# Altium footprint library THU.PcbLib: 477 footprints (part 21 of 30)
Each footprint in its own frame and in the unit in brackets; x right, y up, seen from the top. Pads: shape width x height; smd on the part's side, far side on the other; paste and mask are expansions set on the pad; w line width, h text height; cw(c..) or ccw(c..) is an arc to the next point about the centre after c.
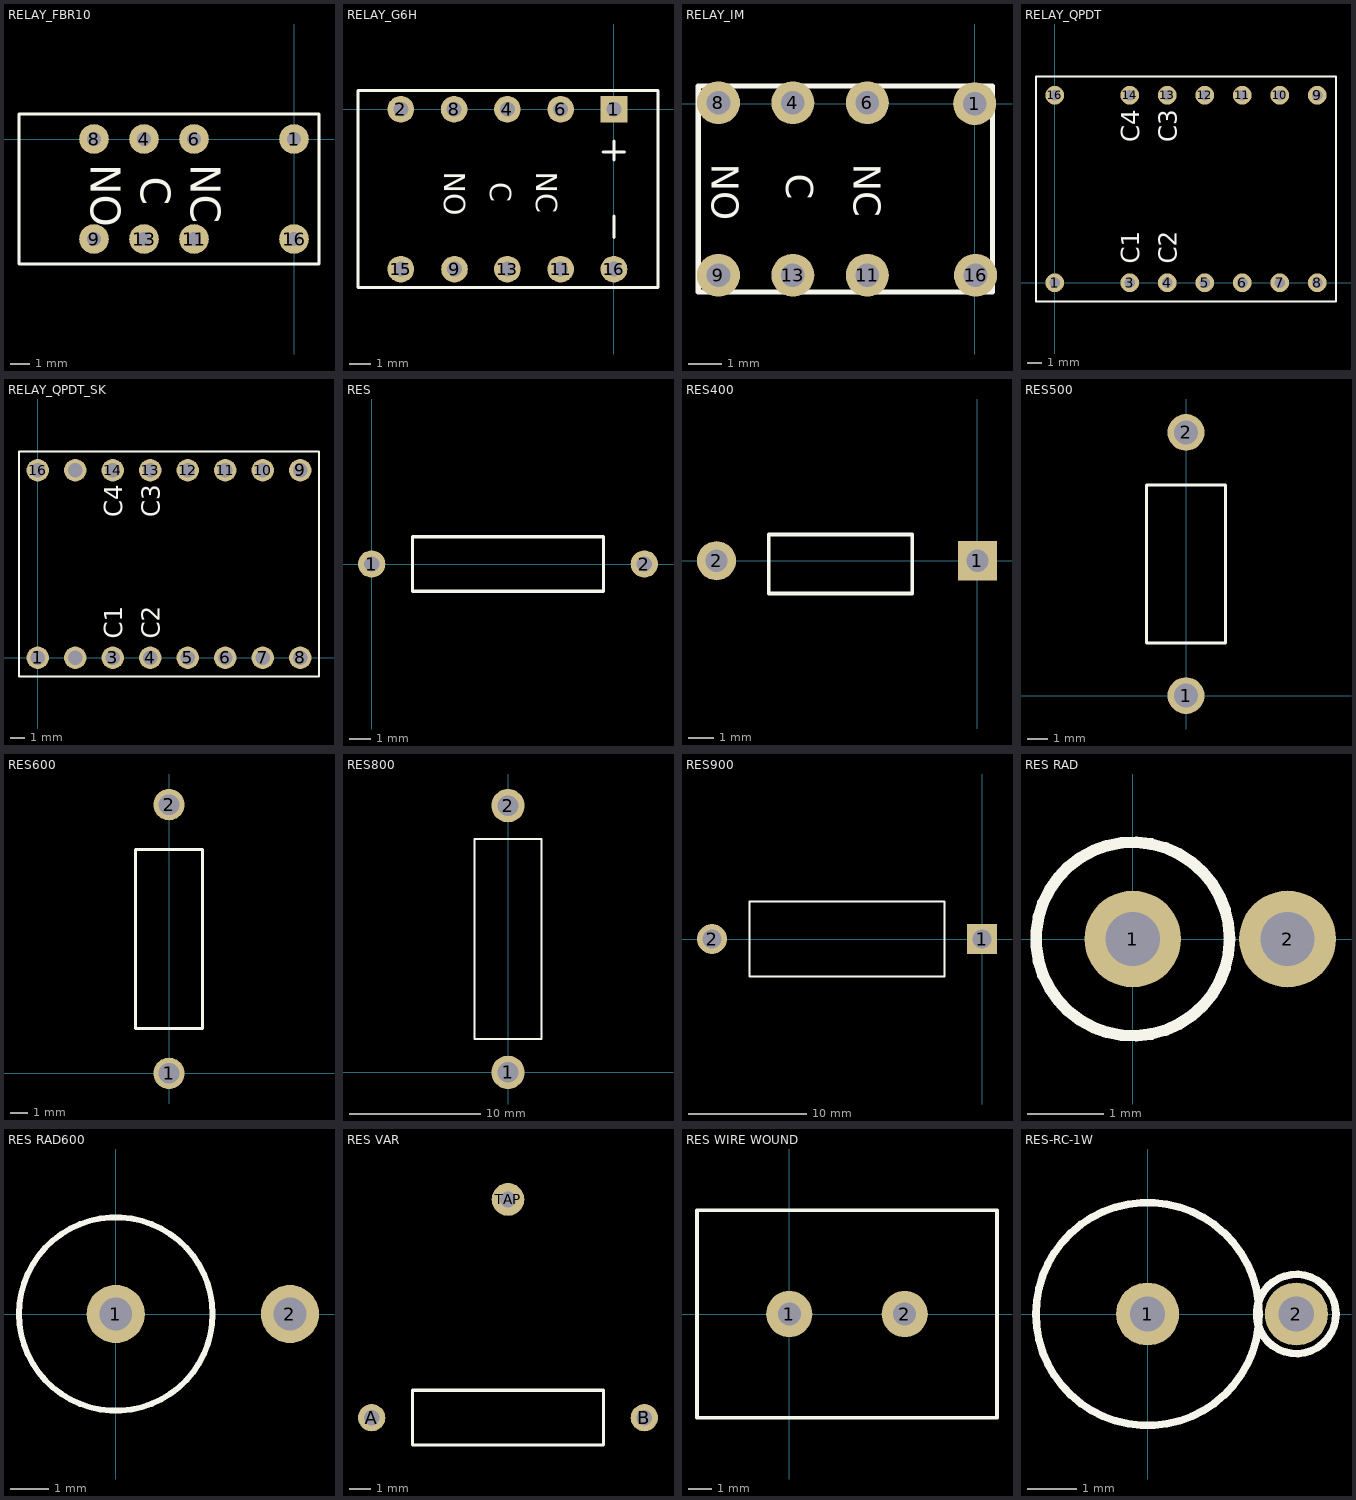
[diagram p20: the footprints below, top view; thin cyan lines are the x and y axes]

## RELAY_FBR10 [mm]
pads (8):
  round 1.5 hole 0.7: 1(0,0) 4(-7.62,0) 6(-5.08,0) 8(-10.16,0) 9(-10.16,-5.08) 11(-5.08,-5.08) 13(-7.62,-5.08) 16(0,-5.08)
TopOverlay:
  lines w0.152: -13.97,-6.35 1.27,-6.35 1.27,1.27 -13.97,1.27 -13.97,-6.35
  text "NO" at -10.335,-1.27 h1.52
  text "NC" at -5.255,-1.27 h1.52
  text "C" at -7.795,-1.905 h1.52

## RELAY_G6H [mil]
pads (10):
  rect 50x50 hole 28: 1(0,0)
  round 50 hole 28: 2(-400,0) 4(-200,0) 6(-100,0) 8(-300,0) 9(-299.21,-300) 11(-100,-300) 13(-200,-300) 15(-400,-300) 16(0,-300)
TopOverlay:
  lines w6: -20,-80 20,-80 ; 0,-240 0,-200 ; 0,-95 0,-60 ; -480.31,-334.65 -480.31,35.43 82.68,35.43 82.68,-334.65 -480.31,-334.65
  text "C" at -232.28,-136.61 h39.37
  text "NC" at -145.67,-116.93 h39.37
  text "NO" at -318.9,-116.93 h39.37

## RELAY_IM [mm]
pads (8):
  round 1.27 hole 0.7: 1(0,0) 4(-5.375,0.025) 6(-3.175,0.025) 8(-7.575,0.025) 9(-7.575,-5.075) 11(-3.175,-5.075) 13(-5.375,-5.075) 16(0.025,-5.075)
TopOverlay:
  lines w0.152: -8.175,-5.575 -8.175,0.525 0.525,0.525 0.525,-5.575 -8.175,-5.575
  text "NC" at -3.575,-1.775 h0.8
  text "C" at -5.575,-2.075 h0.8
  text "NO" at -7.775,-1.775 h0.8

## RELAY_QPDT [mil]
pads (14):
  round 50 hole 28: 1(0,0) 3(200,0) 4(300,0) 5(400,0) 6(500,0) 7(600,0) 8(700,0) 9(700,500) 10(600,500) 11(500,500) 12(400,500) 13(300,500) 14(200,500) 16(0,500)
TopOverlay:
  lines w6: -50,-50 -50,550 750,550 750,-50 -50,-50
  text "C3" at 325,375 h48
  text "C4" at 225,375 h48
  text "C2" at 325,50 h48
  text "C1" at 225,50 h48

## RELAY_QPDT_SK [mil]
pads (16):
  round 60 hole 38: 1(0,0) 3(200,0) 4(300,0) 5(400,0) 6(500,0) 7(600,0) 8(700,0) 9(700,500) 10(600,500) 11(500,500) 12(400,500) 13(300,500) 14(200,500) 16(0,500) ""(100,0) ""(100,500)
TopOverlay:
  lines w6: -50,-50 750,-50 750,550 -50,550 -50,-50
  text "C1" at 225,50 h48
  text "C2" at 325,50 h48
  text "C4" at 225,375 h48
  text "C3" at 325,375 h48

## RES [mil]
pads (2):
  round 50 hole 28: 1(0,0) 2(500,0)
TopOverlay:
  lines w6: 75,-50 425,-50 425,50 75,50 75,-50

## RES400 [mil]
pads (2):
  rect 60x60 hole 34: 1(0,0)
  round 60 hole 34: 2(-400,0)
TopOverlay:
  lines w6: -320,-50 -100,-50 -100,40 -320,40 -320,-50

## RES500 [mil]
pads (2):
  round 70 hole 46: 1(0,0) 2(0,500)
TopOverlay:
  lines w6: -75,100 75,100 75,400 -75,400 -75,100

## RES600 [mil]
pads (2):
  round 70 hole 46: 1(0,0) 2(0,600)
TopOverlay:
  lines w6: -75,100 75,100 75,500 -75,500 -75,100

## RES800 [mil]
pads (2):
  round 100 hole 62: 1(0,0) 2(0,800)
TopOverlay:
  lines w6: -100,100 100,100 100,700 -100,700 -100,100

## RES900 [mil]
pads (2):
  rect 100x100 hole 62: 1(0,0)
  round 100 hole 62: 2(-900,0)
TopOverlay:
  lines w6: -775,-125 -125,-125 -125,125 -775,125 -775,-125

## RES RAD [mil]
pads (2):
  round 50 hole 28: 1(0,0) 2(80,0)
TopOverlay:
  circle w6: c0,0 r50

## RES RAD600 [mil]
pads (2):
  round 60 hole 34: 1(0,0) 2(180,0)
TopOverlay:
  circle w6: c0,0 r100

## RES VAR [mil]
pads (3):
  round 50 hole 28: A(-2125,-625) B(-1625,-625)
  round 60 hole 30: TAP(-1875,-225)
TopOverlay:
  lines w6: -2050,-675 -1700,-675 -1700,-575 -2050,-575 -2050,-675

## RES WIRE WOUND [mm]
pads (2):
  round 2 hole 1: 1(0,0) 2(5,0)
TopOverlay:
  lines w0.152: -4,-4.5 -4,0 -4,4.5 9,4.5 9,0 9,-4.5 -4,-4.5

## RES-RC-1W [mil]
pads (2):
  round 50 hole 28: 1(0,0) 2(118.11,0)
TopOverlay:
  circle w6: c0,0 r88.58
  circle w6: c118.11,0 r31.5